# Altium footprint library NXP_60_26022015.PCBLIB: 287 footprints (part 9 of 18)
Each footprint in its own frame and in the unit in brackets; x right, y up, seen from the top. Pads: shape width x height; smd on the part's side, far side on the other; paste and mask are expansions set on the pad; w line width, h text height; cw(c..) or ccw(c..) is an arc to the next point about the centre after c.
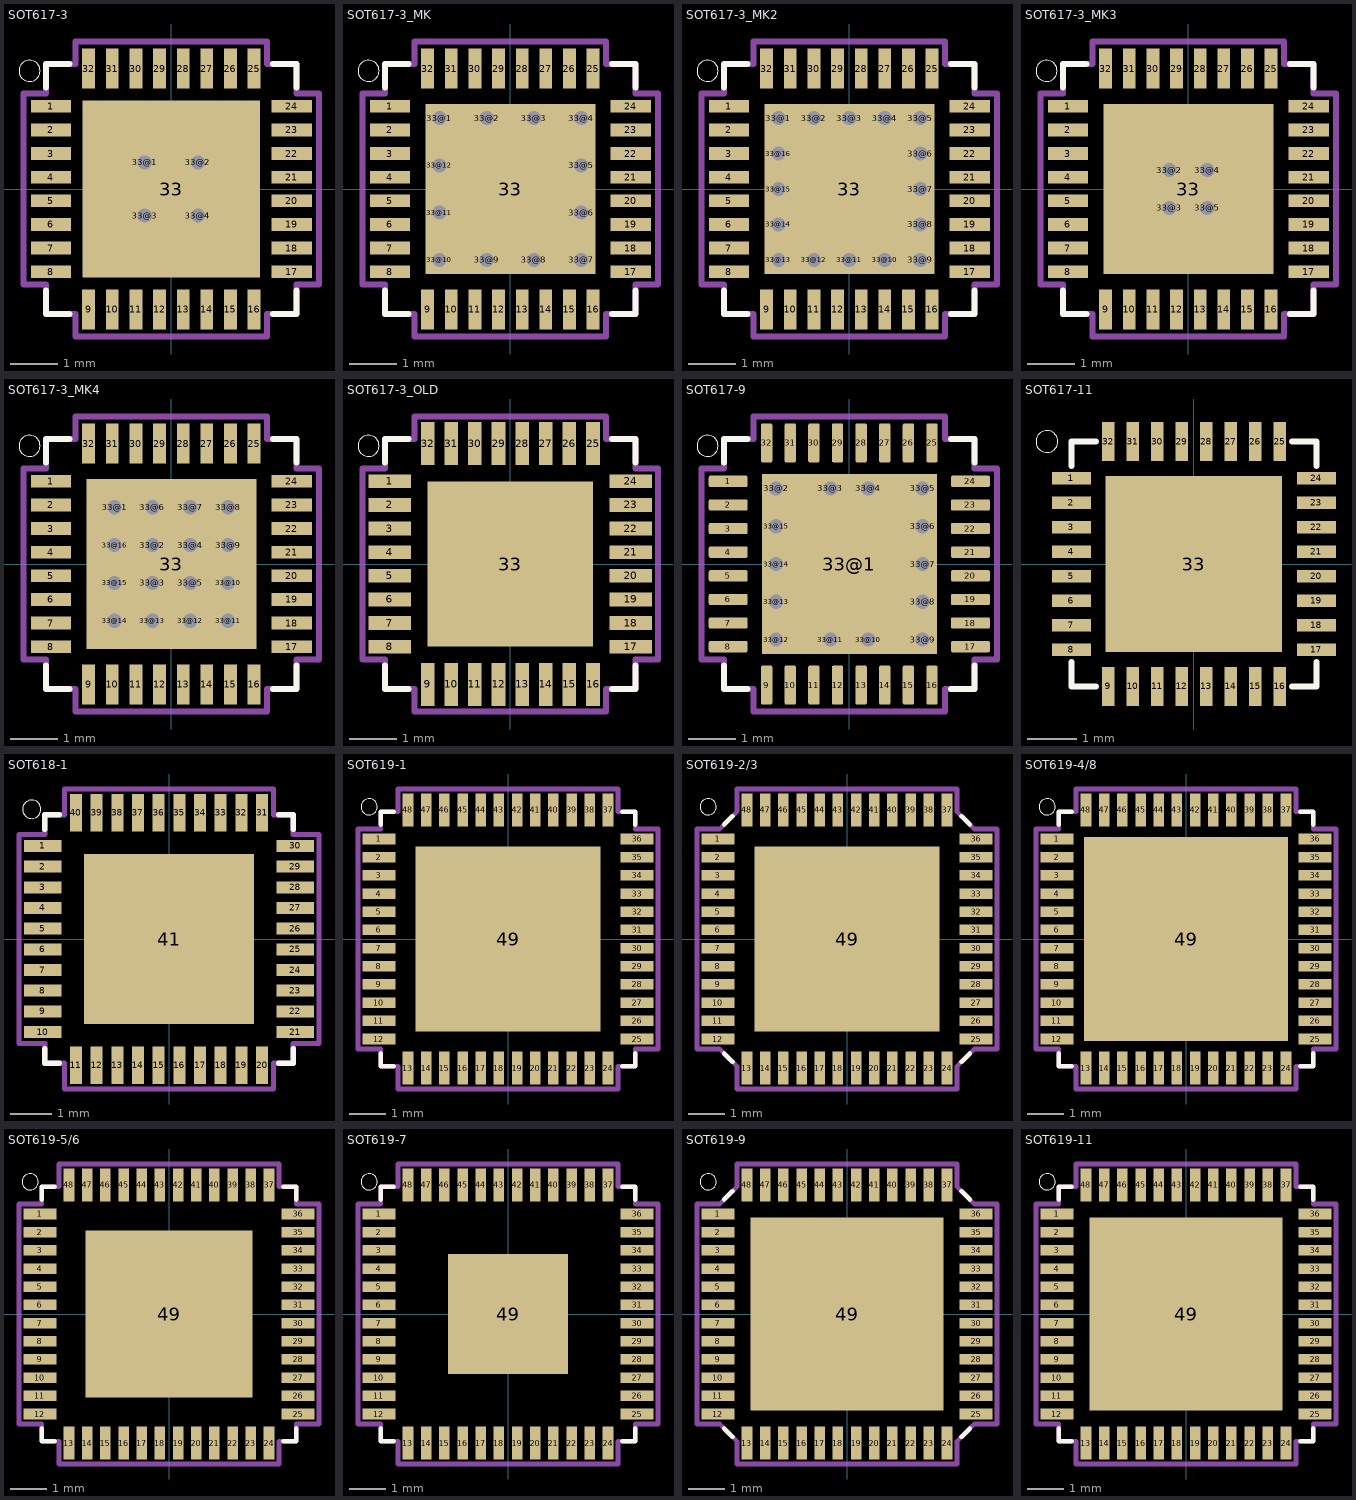
[diagram p8: the footprints below, top view; thin cyan lines are the x and y axes]

## SOT617-3 [mm]
pads (37):
  rect 0.85x0.27 smd: 1(-2.55,1.75) 2(-2.55,1.25) 3(-2.55,0.75) 4(-2.55,0.25) 5(-2.55,-0.25) 6(-2.55,-0.75) 7(-2.55,-1.25) 8(-2.55,-1.75) 17(2.55,-1.75) 18(2.55,-1.25) 19(2.55,-0.75) 20(2.55,-0.25) 21(2.55,0.25) 22(2.55,0.75) 23(2.55,1.25) 24(2.55,1.75)
  rect 0.27x0.85 smd: 9(-1.75,-2.55) 10(-1.25,-2.55) 11(-0.75,-2.55) 12(-0.25,-2.55) 13(0.25,-2.55) 14(0.75,-2.55) 15(1.25,-2.55) 16(1.75,-2.55) 25(1.75,2.55) 26(1.25,2.55) 27(0.75,2.55) 28(0.25,2.55) 29(-0.25,2.55) 30(-0.75,2.55) 31(-1.25,2.55) 32(-1.75,2.55)
  rect 3.75x3.75 smd: 33(0,0)
  round 0.6 hole 0.3: 33@1(-0.563,0.563) 33@2(0.563,0.563) 33@3(-0.563,-0.563) 33@4(0.563,-0.563)
Top Overlay:
  circle w0: c-3,2.5 r0.224
  lines w0.127: -2.65,-2.15 -2.65,-2.65 -2.15,-2.65 ; -2.65,2.15 -2.65,2.65 -2.15,2.65 ; 2.15,-2.65 2.65,-2.65 2.65,-2.15 ; 2.15,2.65 2.65,2.65 2.65,2.15
Top Paste:
  circle w0: c0,0 r0.3
  circle w0: c-1.125,1.125 r0.3
  circle w0: c0,1.125 r0.3
  circle w0: c1.125,1.125 r0.3
  circle w0: c1.125,0 r0.3
  circle w0: c1.125,-1.125 r0.3
  circle w0: c0,-1.125 r0.3
  circle w0: c-1.125,-1.125 r0.3
  circle w0: c-1.125,0 r0.3
Mechanical 16:
  lines w0.127: -3.125,-2.025 -3.125,2.025 -2.65,2.025 -2.65,2.65 -2.025,2.65 -2.025,3.125 2.025,3.125 2.025,2.65 2.65,2.65 2.65,2.025 3.125,2.025 3.125,-2.025 2.65,-2.025 2.65,-2.65 2.025,-2.65 2.025,-3.125 -2.025,-3.125 -2.025,-2.65 -2.65,-2.65 -2.65,-2.025 -3.125,-2.025

## SOT617-3_MK [mm]
pads (45):
  rect 0.85x0.27 smd: 1(-2.55,1.75) 2(-2.55,1.25) 3(-2.55,0.75) 4(-2.55,0.25) 5(-2.55,-0.25) 6(-2.55,-0.75) 7(-2.55,-1.25) 8(-2.55,-1.75) 17(2.55,-1.75) 18(2.55,-1.25) 19(2.55,-0.75) 20(2.55,-0.25) 21(2.55,0.25) 22(2.55,0.75) 23(2.55,1.25) 24(2.55,1.75)
  rect 0.27x0.85 smd: 9(-1.75,-2.55) 10(-1.25,-2.55) 11(-0.75,-2.55) 12(-0.25,-2.55) 13(0.25,-2.55) 14(0.75,-2.55) 15(1.25,-2.55) 16(1.75,-2.55) 25(1.75,2.55) 26(1.25,2.55) 27(0.75,2.55) 28(0.25,2.55) 29(-0.25,2.55) 30(-0.75,2.55) 31(-1.25,2.55) 32(-1.75,2.55)
  rect 3.6x3.6 smd: 33(0,0)
  round 0.6 hole 0.3: 33@1(-1.5,1.5) 33@2(-0.5,1.5) 33@3(0.5,1.5) 33@4(1.5,1.5) 33@5(1.5,0.5) 33@6(1.5,-0.5) 33@7(1.5,-1.5) 33@8(0.5,-1.5) 33@9(-0.5,-1.5) 33@10(-1.5,-1.5) 33@11(-1.5,-0.5) 33@12(-1.5,0.5)
Top Overlay:
  circle w0: c-3,2.5 r0.224
  lines w0.127: -2.65,-2.15 -2.65,-2.65 -2.15,-2.65 ; -2.65,2.15 -2.65,2.65 -2.15,2.65 ; 2.15,-2.65 2.65,-2.65 2.65,-2.15 ; 2.15,2.65 2.65,2.65 2.65,2.15
Top Paste:
  rectangle: -0.25,-0.25 0.25,0.25
  rectangle: -1.05,-0.25 -0.55,0.25
  rectangle: 0.55,-0.25 1.05,0.25
  rectangle: -0.25,0.55 0.25,1.05
  rectangle: -0.25,-1.05 0.25,-0.55
  rectangle: 0.55,0.55 1.05,1.05
  rectangle: -1.05,0.55 -0.55,1.05
  rectangle: -1.05,-1.05 -0.55,-0.55
  rectangle: 0.55,-1.05 1.05,-0.55
Mechanical 16:
  lines w0.127: -3.125,-2.025 -3.125,2.025 -2.65,2.025 -2.65,2.65 -2.025,2.65 -2.025,3.125 2.025,3.125 2.025,2.65 2.65,2.65 2.65,2.025 3.125,2.025 3.125,-2.025 2.65,-2.025 2.65,-2.65 2.025,-2.65 2.025,-3.125 -2.025,-3.125 -2.025,-2.65 -2.65,-2.65 -2.65,-2.025 -3.125,-2.025

## SOT617-3_MK2 [mm]
pads (49):
  rect 0.85x0.27 smd: 1(-2.55,1.75) 2(-2.55,1.25) 3(-2.55,0.75) 4(-2.55,0.25) 5(-2.55,-0.25) 6(-2.55,-0.75) 7(-2.55,-1.25) 8(-2.55,-1.75) 17(2.55,-1.75) 18(2.55,-1.25) 19(2.55,-0.75) 20(2.55,-0.25) 21(2.55,0.25) 22(2.55,0.75) 23(2.55,1.25) 24(2.55,1.75)
  rect 0.27x0.85 smd: 9(-1.75,-2.55) 10(-1.25,-2.55) 11(-0.75,-2.55) 12(-0.25,-2.55) 13(0.25,-2.55) 14(0.75,-2.55) 15(1.25,-2.55) 16(1.75,-2.55) 25(1.75,2.55) 26(1.25,2.55) 27(0.75,2.55) 28(0.25,2.55) 29(-0.25,2.55) 30(-0.75,2.55) 31(-1.25,2.55) 32(-1.75,2.55)
  rect 3.6x3.6 smd: 33(0,0)
  round 0.6 hole 0.3: 33@1(-1.5,1.5) 33@2(-0.75,1.5) 33@3(0,1.5) 33@4(0.75,1.5) 33@5(1.5,1.5) 33@6(1.5,0.75) 33@7(1.5,0) 33@8(1.5,-0.75) 33@9(1.5,-1.5) 33@10(0.75,-1.5) 33@11(0,-1.5) 33@12(-0.75,-1.5) 33@13(-1.5,-1.5) 33@14(-1.5,-0.75) 33@15(-1.5,0) 33@16(-1.5,0.75)
Top Overlay:
  circle w0: c-3,2.5 r0.224
  lines w0.127: -2.65,-2.15 -2.65,-2.65 -2.15,-2.65 ; -2.65,2.15 -2.65,2.65 -2.15,2.65 ; 2.15,-2.65 2.65,-2.65 2.65,-2.15 ; 2.15,2.65 2.65,2.65 2.65,2.15
Top Paste:
  rectangle: -0.25,-0.25 0.25,0.25
  rectangle: -1.05,-0.25 -0.55,0.25
  rectangle: 0.55,-0.25 1.05,0.25
  rectangle: -0.25,0.55 0.25,1.05
  rectangle: -0.25,-1.05 0.25,-0.55
  rectangle: 0.55,0.55 1.05,1.05
  rectangle: -1.05,0.55 -0.55,1.05
  rectangle: -1.05,-1.05 -0.55,-0.55
  rectangle: 0.55,-1.05 1.05,-0.55
Mechanical 16:
  lines w0.127: -3.125,-2.025 -3.125,2.025 -2.65,2.025 -2.65,2.65 -2.025,2.65 -2.025,3.125 2.025,3.125 2.025,2.65 2.65,2.65 2.65,2.025 3.125,2.025 3.125,-2.025 2.65,-2.025 2.65,-2.65 2.025,-2.65 2.025,-3.125 -2.025,-3.125 -2.025,-2.65 -2.65,-2.65 -2.65,-2.025 -3.125,-2.025

## SOT617-3_MK3 [mm]
pads (37):
  rect 0.85x0.27 smd: 1(-2.55,1.75) 2(-2.55,1.25) 3(-2.55,0.75) 4(-2.55,0.25) 5(-2.55,-0.25) 6(-2.55,-0.75) 7(-2.55,-1.25) 8(-2.55,-1.75) 17(2.55,-1.75) 18(2.55,-1.25) 19(2.55,-0.75) 20(2.55,-0.25) 21(2.55,0.25) 22(2.55,0.75) 23(2.55,1.25) 24(2.55,1.75)
  rect 0.27x0.85 smd: 9(-1.75,-2.55) 10(-1.25,-2.55) 11(-0.75,-2.55) 12(-0.25,-2.55) 13(0.25,-2.55) 14(0.75,-2.55) 15(1.25,-2.55) 16(1.75,-2.55) 25(1.75,2.55) 26(1.25,2.55) 27(0.75,2.55) 28(0.25,2.55) 29(-0.25,2.55) 30(-0.75,2.55) 31(-1.25,2.55) 32(-1.75,2.55)
  rect 3.6x3.6 smd: 33(0,0)
  round 0.6 hole 0.3: 33@2(-0.4,0.4) 33@3(-0.4,-0.4) 33@4(0.4,0.4) 33@5(0.4,-0.4)
Top Overlay:
  circle w0: c-3,2.5 r0.224
  lines w0.127: -2.65,-2.15 -2.65,-2.65 -2.15,-2.65 ; -2.65,2.15 -2.65,2.65 -2.15,2.65 ; 2.15,-2.65 2.65,-2.65 2.65,-2.15 ; 2.15,2.65 2.65,2.65 2.65,2.15
Top Paste:
  rectangle: -0.25,-0.25 0.25,0.25
  rectangle: -1.05,-0.25 -0.55,0.25
  rectangle: 0.55,-0.25 1.05,0.25
  rectangle: -0.25,0.55 0.25,1.05
  rectangle: -0.25,-1.05 0.25,-0.55
  rectangle: 0.55,0.55 1.05,1.05
  rectangle: -1.05,0.55 -0.55,1.05
  rectangle: -1.05,-1.05 -0.55,-0.55
  rectangle: 0.55,-1.05 1.05,-0.55
Mechanical 16:
  lines w0.127: -3.125,-2.025 -3.125,2.025 -2.65,2.025 -2.65,2.65 -2.025,2.65 -2.025,3.125 2.025,3.125 2.025,2.65 2.65,2.65 2.65,2.025 3.125,2.025 3.125,-2.025 2.65,-2.025 2.65,-2.65 2.025,-2.65 2.025,-3.125 -2.025,-3.125 -2.025,-2.65 -2.65,-2.65 -2.65,-2.025 -3.125,-2.025

## SOT617-3_MK4 [mm]
pads (49):
  rect 0.85x0.27 smd: 1(-2.55,1.75) 2(-2.55,1.25) 3(-2.55,0.75) 4(-2.55,0.25) 5(-2.55,-0.25) 6(-2.55,-0.75) 7(-2.55,-1.25) 8(-2.55,-1.75) 17(2.55,-1.75) 18(2.55,-1.25) 19(2.55,-0.75) 20(2.55,-0.25) 21(2.55,0.25) 22(2.55,0.75) 23(2.55,1.25) 24(2.55,1.75)
  rect 0.27x0.85 smd: 9(-1.75,-2.55) 10(-1.25,-2.55) 11(-0.75,-2.55) 12(-0.25,-2.55) 13(0.25,-2.55) 14(0.75,-2.55) 15(1.25,-2.55) 16(1.75,-2.55) 25(1.75,2.55) 26(1.25,2.55) 27(0.75,2.55) 28(0.25,2.55) 29(-0.25,2.55) 30(-0.75,2.55) 31(-1.25,2.55) 32(-1.75,2.55)
  rect 3.6x3.6 smd: 33(0,0)
  round 0.6 hole 0.3: 33@1(-1.2,1.2) 33@2(-0.4,0.4) 33@3(-0.4,-0.4) 33@4(0.4,0.4) 33@5(0.4,-0.4) 33@6(-0.4,1.2) 33@7(0.4,1.2) 33@8(1.2,1.2) 33@9(1.2,0.4) 33@10(1.2,-0.4) 33@11(1.2,-1.2) 33@12(0.4,-1.2) 33@13(-0.4,-1.2) 33@14(-1.2,-1.2) 33@15(-1.2,-0.4) 33@16(-1.2,0.4)
Top Overlay:
  circle w0: c-3,2.5 r0.224
  lines w0.127: -2.65,-2.15 -2.65,-2.65 -2.15,-2.65 ; -2.65,2.15 -2.65,2.65 -2.15,2.65 ; 2.15,-2.65 2.65,-2.65 2.65,-2.15 ; 2.15,2.65 2.65,2.65 2.65,2.15
Top Paste:
  rectangle: -0.25,-0.25 0.25,0.25
  rectangle: -1.05,-0.25 -0.55,0.25
  rectangle: 0.55,-0.25 1.05,0.25
  rectangle: -0.25,0.55 0.25,1.05
  rectangle: -0.25,-1.05 0.25,-0.55
  rectangle: 0.55,0.55 1.05,1.05
  rectangle: -1.05,0.55 -0.55,1.05
  rectangle: -1.05,-1.05 -0.55,-0.55
  rectangle: 0.55,-1.05 1.05,-0.55
Mechanical 16:
  lines w0.127: -3.125,-2.025 -3.125,2.025 -2.65,2.025 -2.65,2.65 -2.025,2.65 -2.025,3.125 2.025,3.125 2.025,2.65 2.65,2.65 2.65,2.025 3.125,2.025 3.125,-2.025 2.65,-2.025 2.65,-2.65 2.025,-2.65 2.025,-3.125 -2.025,-3.125 -2.025,-2.65 -2.65,-2.65 -2.65,-2.025 -3.125,-2.025

## SOT617-3_OLD [mm]
pads (33):
  rect 0.9x0.29 smd: 1(-2.55,1.75) 2(-2.55,1.25) 3(-2.55,0.75) 4(-2.55,0.25) 5(-2.55,-0.25) 6(-2.55,-0.75) 7(-2.55,-1.25) 8(-2.55,-1.75) 17(2.55,-1.75) 18(2.55,-1.25) 19(2.55,-0.75) 20(2.55,-0.25) 21(2.55,0.25) 22(2.55,0.75) 23(2.55,1.25) 24(2.55,1.75)
  rect 0.29x0.9 smd: 9(-1.75,-2.55) 10(-1.25,-2.55) 11(-0.75,-2.55) 12(-0.25,-2.55) 13(0.25,-2.55) 14(0.75,-2.55) 15(1.25,-2.55) 16(1.75,-2.55) 25(1.75,2.55) 26(1.25,2.55) 27(0.75,2.55) 28(0.25,2.55) 29(-0.25,2.55) 30(-0.75,2.55) 31(-1.25,2.55) 32(-1.75,2.55)
  rect 3.5x3.5 smd: 33(0,0)
Top Overlay:
  circle w0: c-3,2.5 r0.224
  lines w0.127: -2.65,-2.15 -2.65,-2.65 -2.15,-2.65 ; -2.65,2.15 -2.65,2.65 -2.15,2.65 ; 2.15,-2.65 2.65,-2.65 2.65,-2.15 ; 2.15,2.65 2.65,2.65 2.65,2.15
Top Paste:
  rectangle: -0.25,-0.25 0.25,0.25
  rectangle: -1.05,-0.25 -0.55,0.25
  rectangle: 0.55,-0.25 1.05,0.25
  rectangle: -0.25,0.55 0.25,1.05
  rectangle: -0.25,-1.05 0.25,-0.55
  rectangle: 0.55,0.55 1.05,1.05
  rectangle: -1.05,0.55 -0.55,1.05
  rectangle: -1.05,-1.05 -0.55,-0.55
  rectangle: 0.55,-1.05 1.05,-0.55
Mechanical 16:
  lines w0.127: -3.125,-2.025 -3.125,2.025 -2.65,2.025 -2.65,2.65 -2.025,2.65 -2.025,3.125 2.025,3.125 2.025,2.65 2.65,2.65 2.65,2.025 3.125,2.025 3.125,-2.025 2.65,-2.025 2.65,-2.65 2.025,-2.65 2.025,-3.125 -2.025,-3.125 -2.025,-2.65 -2.65,-2.65 -2.65,-2.025 -3.125,-2.025

## SOT617-9 [mm]
pads (47):
  rrect30% 0.825x0.24 smd: 1(-2.563,1.75) 2(-2.563,1.25) 3(-2.563,0.75) 4(-2.563,0.25) 5(-2.563,-0.25) 6(-2.563,-0.75) 7(-2.563,-1.25) 8(-2.563,-1.75) 17(2.563,-1.75) 18(2.563,-1.25) 19(2.563,-0.75) 20(2.563,-0.25) 21(2.563,0.25) 22(2.563,0.75) 23(2.563,1.25) 24(2.563,1.75)
  rrect30% 0.24x0.825 smd: 9(-1.75,-2.563) 10(-1.25,-2.563) 11(-0.75,-2.563) 12(-0.25,-2.563) 13(0.25,-2.563) 14(0.75,-2.563) 15(1.25,-2.563) 16(1.75,-2.563) 25(1.75,2.563) 26(1.25,2.563) 27(0.75,2.563) 28(0.25,2.563) 29(-0.25,2.563) 30(-0.75,2.563) 31(-1.25,2.563) 32(-1.75,2.563)
  rect 3.7x3.8 smd: 33@1(0,0)
  round 0.6 hole 0.3: 33@2(-1.55,1.6) 33@3(-0.4,1.6) 33@4(0.4,1.6) 33@5(1.55,1.6) 33@6(1.55,0.8) 33@7(1.55,0) 33@8(1.55,-0.8) 33@9(1.55,-1.6) 33@10(0.4,-1.6) 33@11(-0.4,-1.6) 33@12(-1.55,-1.6) 33@13(-1.55,-0.8) 33@14(-1.55,0) 33@15(-1.55,0.8)
Top Overlay:
  circle w0: c-3,2.5 r0.224
  lines w0.127: -2.65,-2.15 -2.65,-2.65 -2.15,-2.65 ; -2.65,2.15 -2.65,2.65 -2.15,2.65 ; 2.15,-2.65 2.65,-2.65 2.65,-2.15 ; 2.15,2.65 2.65,2.65 2.65,2.15
Top Paste:
  rectangle: -1.025,0.25 -0.225,1.05
  rectangle: 0.225,0.25 1.025,1.05
  rectangle: 0.225,-1.05 1.025,-0.25
  rectangle: -1.025,-1.05 -0.225,-0.25
Mechanical 16:
  lines w0.127: -3.125,-2.025 -3.125,2.025 -2.65,2.025 -2.65,2.65 -2.025,2.65 -2.025,3.125 2.025,3.125 2.025,2.65 2.65,2.65 2.65,2.025 3.125,2.025 3.125,-2.025 2.65,-2.025 2.65,-2.65 2.025,-2.65 2.025,-3.125 -2.025,-3.125 -2.025,-2.65 -2.65,-2.65 -2.65,-2.025 -3.125,-2.025

## SOT617-11 [mil]
pads (33):
  rect 31.5x9.84 smd: 1(-98.43,68.9) 2(-98.43,49.21) 3(-98.43,29.53) 4(-98.43,9.84) 5(-98.43,-9.84) 6(-98.43,-29.53) 7(-98.43,-49.21) 8(-98.43,-68.9) 17(98.43,-68.9) 18(98.43,-49.21) 19(98.43,-29.53) 20(98.43,-9.84) 21(98.43,9.84) 22(98.43,29.53) 23(98.43,49.21) 24(98.43,68.9)
  rect 9.84x31.5 smd: 9(-68.9,-98.43) 10(-49.21,-98.43) 11(-29.53,-98.43) 12(-9.84,-98.43) 13(9.84,-98.43) 14(29.53,-98.43) 15(49.21,-98.43) 16(68.9,-98.43) 25(68.9,98.43) 26(49.21,98.43) 27(29.53,98.43) 28(9.84,98.43) 29(-9.84,98.43) 30(-29.53,98.43) 31(-49.21,98.43) 32(-68.9,98.43)
  rect 141.73x141.73 smd: 33(0,0)
Top Overlay:
  circle w0: c-118.11,98.43 r8.8
  lines w5: -98.43,-78.74 -98.43,-98.43 -78.74,-98.43 ; -98.43,78.74 -98.43,98.43 -78.74,98.43 ; 78.74,-98.43 98.43,-98.43 98.43,-78.74 ; 78.74,98.43 98.43,98.43 98.43,78.74
Top Paste:
  rectangle: -17.72,-17.72 17.72,17.72
  rectangle: 27.56,-17.72 62.99,17.72
  rectangle: -17.72,27.56 17.72,62.99
  rectangle: -62.99,27.56 -27.56,62.99
  rectangle: -62.99,-17.72 -27.56,17.72
  rectangle: -62.99,-62.99 -27.56,-27.56
  rectangle: -17.72,-62.99 17.72,-27.56
  rectangle: 27.56,-62.99 62.99,-27.56
  rectangle: 27.56,27.56 62.99,62.99
  rectangle: -13.78,83.66 -5.91,113.19
  rectangle: -33.46,83.66 -25.59,113.19
  rectangle: -53.15,83.66 -45.28,113.19
  rectangle: -72.83,83.66 -64.96,113.19
  rectangle: 5.91,83.66 13.78,113.19
  rectangle: 25.59,83.66 33.46,113.19
  rectangle: 45.28,83.66 53.15,113.19
  rectangle: 64.96,83.66 72.83,113.19
  rectangle: -72.83,-113.19 -64.96,-83.66
  rectangle: -53.15,-113.19 -45.28,-83.66
  rectangle: -33.46,-113.19 -25.59,-83.66
  rectangle: -13.78,-113.19 -5.91,-83.66
  rectangle: 5.91,-113.19 13.78,-83.66
  rectangle: 25.59,-113.19 33.46,-83.66
  rectangle: 45.28,-113.19 53.15,-83.66
  rectangle: 64.96,-113.19 72.83,-83.66
  region: 113.19,5.91 113.19,13.78 83.66,13.78 83.66,5.91
  region: 113.19,25.59 113.19,33.46 83.66,33.46 83.66,25.59
  region: 113.19,45.28 113.19,53.15 83.66,53.15 83.66,45.28
  region: 113.19,64.96 113.19,72.83 83.66,72.83 83.66,64.96
  region: 113.19,-13.78 113.19,-5.91 83.66,-5.91 83.66,-13.78
  region: 113.19,-33.46 113.19,-25.59 83.66,-25.59 83.66,-33.46
  region: 113.19,-53.15 113.19,-45.28 83.66,-45.28 83.66,-53.15
  region: 113.19,-72.83 113.19,-64.96 83.66,-64.96 83.66,-72.83
  region: -83.66,-72.83 -83.66,-64.96 -113.19,-64.96 -113.19,-72.83
  region: -83.66,-53.15 -83.66,-45.28 -113.19,-45.28 -113.19,-53.15
  region: -83.66,-33.46 -83.66,-25.59 -113.19,-25.59 -113.19,-33.46
  region: -83.66,-13.78 -83.66,-5.91 -113.19,-5.91 -113.19,-13.78
  region: -83.66,5.91 -83.66,13.78 -113.19,13.78 -113.19,5.91
  region: -83.66,25.59 -83.66,33.46 -113.19,33.46 -113.19,25.59
  region: -83.66,45.28 -83.66,53.15 -113.19,53.15 -113.19,45.28
  region: -83.66,64.96 -83.66,72.83 -113.19,72.83 -113.19,64.96

## SOT618-1 [mm]
pads (41):
  rect 0.9x0.29 smd: 1(-3.05,2.25) 2(-3.05,1.75) 3(-3.05,1.25) 4(-3.05,0.75) 5(-3.05,0.25) 6(-3.05,-0.25) 7(-3.05,-0.75) 8(-3.05,-1.25) 9(-3.05,-1.75) 10(-3.05,-2.25) 21(3.05,-2.25) 22(3.05,-1.75) 23(3.05,-1.25) 24(3.05,-0.75) 25(3.05,-0.25) 26(3.05,0.25) 27(3.05,0.75) 28(3.05,1.25) 29(3.05,1.75) 30(3.05,2.25)
  rect 0.29x0.9 smd: 11(-2.25,-3.05) 12(-1.75,-3.05) 13(-1.25,-3.05) 14(-0.75,-3.05) 15(-0.25,-3.05) 16(0.25,-3.05) 17(0.75,-3.05) 18(1.25,-3.05) 19(1.75,-3.05) 20(2.25,-3.05) 31(2.25,3.05) 32(1.75,3.05) 33(1.25,3.05) 34(0.75,3.05) 35(0.25,3.05) 36(-0.25,3.05) 37(-0.75,3.05) 38(-1.25,3.05) 39(-1.75,3.05) 40(-2.25,3.05)
  rect 4.1x4.1 smd: 41(0,0)
Top Overlay:
  circle w0: c-3.317,3.135 r0.224
  lines w0.127: -3,-2.65 -3,-3 -2.65,-3 ; -3,2.65 -3,3 -2.65,3 ; 2.65,-3 3,-3 3,-2.65 ; 2.65,3 3,3 3,2.65
Top Paste:
  rectangle: -0.3,-0.3 0.3,0.3
  rectangle: 0.6,-0.3 1.2,0.3
  rectangle: -1.2,-0.3 -0.6,0.3
  rectangle: -1.2,0.6 -0.6,1.2
  rectangle: -0.3,0.6 0.3,1.2
  rectangle: 0.6,0.6 1.2,1.2
  rectangle: -1.2,-1.2 -0.6,-0.6
  rectangle: -0.3,-1.2 0.3,-0.6
  rectangle: 0.6,-1.2 1.2,-0.6
Mechanical 16:
  lines w0.127: -3.625,-2.525 -3.625,2.525 -3,2.525 -3,3 -2.525,3 -2.525,3.625 2.525,3.625 2.525,3 3,3 3,2.525 3.625,2.525 3.625,-2.525 3,-2.525 3,-3 2.525,-3 2.525,-3.625 -2.525,-3.625 -2.525,-3 -3,-3 -3,-2.525 -3.625,-2.525

## SOT619-1 [mm]
pads (49):
  rect 0.9x0.29 smd: 1(-3.55,2.75) 2(-3.55,2.25) 3(-3.55,1.75) 4(-3.55,1.25) 5(-3.55,0.75) 6(-3.55,0.25) 7(-3.55,-0.25) 8(-3.55,-0.75) 9(-3.55,-1.25) 10(-3.55,-1.75) 11(-3.55,-2.25) 12(-3.55,-2.75) 25(3.55,-2.75) 26(3.55,-2.25) 27(3.55,-1.75) 28(3.55,-1.25) 29(3.55,-0.75) 30(3.55,-0.25) 31(3.55,0.25) 32(3.55,0.75) 33(3.55,1.25) 34(3.55,1.75) 35(3.55,2.25) 36(3.55,2.75)
  rect 0.29x0.9 smd: 13(-2.75,-3.55) 14(-2.25,-3.55) 15(-1.75,-3.55) 16(-1.25,-3.55) 17(-0.75,-3.55) 18(-0.25,-3.55) 19(0.25,-3.55) 20(0.75,-3.55) 21(1.25,-3.55) 22(1.75,-3.55) 23(2.25,-3.55) 24(2.75,-3.55) 37(2.75,3.55) 38(2.25,3.55) 39(1.75,3.55) 40(1.25,3.55) 41(0.75,3.55) 42(0.25,3.55) 43(-0.25,3.55) 44(-0.75,3.55) 45(-1.25,3.55) 46(-1.75,3.55) 47(-2.25,3.55) 48(-2.75,3.55)
  rect 5.1x5.1 smd: 49(0,0)
Top Overlay:
  circle w0: c-3.818,3.635 r0.224
  lines w0.127: -3.5,-3.15 -3.5,-3.5 -3.15,-3.5 ; -3.5,3.15 -3.5,3.5 -3.15,3.5 ; 3.15,-3.5 3.5,-3.5 3.5,-3.15 ; 3.15,3.5 3.5,3.5 3.5,3.15
Top Paste:
  rectangle: -0.375,-0.375 0.375,0.375
  rectangle: -1.5,-0.375 -0.75,0.375
  rectangle: -1.5,0.75 -0.75,1.5
  rectangle: -0.375,0.75 0.375,1.5
  rectangle: 0.75,0.75 1.5,1.5
  rectangle: 0.75,-0.375 1.5,0.375
  rectangle: 0.75,-1.5 1.5,-0.75
  rectangle: -0.375,-1.5 0.375,-0.75
  rectangle: -1.5,-1.5 -0.75,-0.75
Mechanical 16:
  lines w0.127: -4.125,-3.025 -4.125,3.025 -3.5,3.025 -3.5,3.5 -3.025,3.5 -3.025,4.125 3.025,4.125 3.025,3.5 3.5,3.5 3.5,3.025 4.125,3.025 4.125,-3.025 3.5,-3.025 3.5,-3.5 3.025,-3.5 3.025,-4.125 -3.025,-4.125 -3.025,-3.5 -3.5,-3.5 -3.5,-3.025 -4.125,-3.025

## SOT619-2/3 [mm]
pads (49):
  rect 0.9x0.29 smd: 1(-3.55,2.75) 2(-3.55,2.25) 3(-3.55,1.75) 4(-3.55,1.25) 5(-3.55,0.75) 6(-3.55,0.25) 7(-3.55,-0.25) 8(-3.55,-0.75) 9(-3.55,-1.25) 10(-3.55,-1.75) 11(-3.55,-2.25) 12(-3.55,-2.75) 25(3.55,-2.75) 26(3.55,-2.25) 27(3.55,-1.75) 28(3.55,-1.25) 29(3.55,-0.75) 30(3.55,-0.25) 31(3.55,0.25) 32(3.55,0.75) 33(3.55,1.25) 34(3.55,1.75) 35(3.55,2.25) 36(3.55,2.75)
  rect 0.29x0.9 smd: 13(-2.75,-3.55) 14(-2.25,-3.55) 15(-1.75,-3.55) 16(-1.25,-3.55) 17(-0.75,-3.55) 18(-0.25,-3.55) 19(0.25,-3.55) 20(0.75,-3.55) 21(1.25,-3.55) 22(1.75,-3.55) 23(2.25,-3.55) 24(2.75,-3.55) 37(2.75,3.55) 38(2.25,3.55) 39(1.75,3.55) 40(1.25,3.55) 41(0.75,3.55) 42(0.25,3.55) 43(-0.25,3.55) 44(-0.75,3.55) 45(-1.25,3.55) 46(-1.75,3.55) 47(-2.25,3.55) 48(-2.75,3.55)
  rect 5.1x5.1 smd: 49(0,0)
Top Overlay:
  circle w0: c-3.818,3.635 r0.224
  lines w0.127: -3.375,-3.15 -3.15,-3.375 ; -3.375,3.15 -3.15,3.375 ; 3.15,-3.375 3.375,-3.15 ; 3.15,3.375 3.375,3.15
Top Paste:
  rectangle: -0.375,-0.375 0.375,0.375
  rectangle: -1.5,-0.375 -0.75,0.375
  rectangle: -1.5,0.75 -0.75,1.5
  rectangle: -0.375,0.75 0.375,1.5
  rectangle: 0.75,0.75 1.5,1.5
  rectangle: 0.75,-0.375 1.5,0.375
  rectangle: 0.75,-1.5 1.5,-0.75
  rectangle: -0.375,-1.5 0.375,-0.75
  rectangle: -1.5,-1.5 -0.75,-0.75
Mechanical 16:
  lines w0.127: -4.125,-3.025 -4.125,3.025 -3.5,3.025 -3.025,3.5 -3.025,4.125 3.025,4.125 3.025,3.5 3.5,3.025 4.125,3.025 4.125,-3.025 3.5,-3.025 3.025,-3.5 3.025,-4.125 -3.025,-4.125 -3.025,-3.5 -3.5,-3.025 -4.125,-3.025

## SOT619-4/8 [mm]
pads (49):
  rect 0.9x0.29 smd: 1(-3.55,2.75) 2(-3.55,2.25) 3(-3.55,1.75) 4(-3.55,1.25) 5(-3.55,0.75) 6(-3.55,0.25) 7(-3.55,-0.25) 8(-3.55,-0.75) 9(-3.55,-1.25) 10(-3.55,-1.75) 11(-3.55,-2.25) 12(-3.55,-2.75) 25(3.55,-2.75) 26(3.55,-2.25) 27(3.55,-1.75) 28(3.55,-1.25) 29(3.55,-0.75) 30(3.55,-0.25) 31(3.55,0.25) 32(3.55,0.75) 33(3.55,1.25) 34(3.55,1.75) 35(3.55,2.25) 36(3.55,2.75)
  rect 0.29x0.9 smd: 13(-2.75,-3.55) 14(-2.25,-3.55) 15(-1.75,-3.55) 16(-1.25,-3.55) 17(-0.75,-3.55) 18(-0.25,-3.55) 19(0.25,-3.55) 20(0.75,-3.55) 21(1.25,-3.55) 22(1.75,-3.55) 23(2.25,-3.55) 24(2.75,-3.55) 37(2.75,3.55) 38(2.25,3.55) 39(1.75,3.55) 40(1.25,3.55) 41(0.75,3.55) 42(0.25,3.55) 43(-0.25,3.55) 44(-0.75,3.55) 45(-1.25,3.55) 46(-1.75,3.55) 47(-2.25,3.55) 48(-2.75,3.55)
  rect 5.6x5.6 smd: 49(0,0)
Top Overlay:
  circle w0: c-3.818,3.635 r0.224
  lines w0.127: -3.5,-3.15 -3.5,-3.5 -3.15,-3.5 ; -3.5,3.15 -3.5,3.5 -3.15,3.5 ; 3.15,-3.5 3.5,-3.5 3.5,-3.15 ; 3.15,3.5 3.5,3.5 3.5,3.15
Top Paste:
  rectangle: -0.375,-0.375 0.375,0.375
  rectangle: -1.5,-0.375 -0.75,0.375
  rectangle: -1.5,0.75 -0.75,1.5
  rectangle: -0.375,0.75 0.375,1.5
  rectangle: 0.75,0.75 1.5,1.5
  rectangle: 0.75,-0.375 1.5,0.375
  rectangle: 0.75,-1.5 1.5,-0.75
  rectangle: -0.375,-1.5 0.375,-0.75
  rectangle: -1.5,-1.5 -0.75,-0.75
Mechanical 16:
  lines w0.127: -4.125,-3.025 -4.125,3.025 -3.5,3.025 -3.5,3.5 -3.025,3.5 -3.025,4.125 3.025,4.125 3.025,3.5 3.5,3.5 3.5,3.025 4.125,3.025 4.125,-3.025 3.5,-3.025 3.5,-3.5 3.025,-3.5 3.025,-4.125 -3.025,-4.125 -3.025,-3.5 -3.5,-3.5 -3.5,-3.025 -4.125,-3.025

## SOT619-5/6 [mm]
pads (49):
  rect 0.9x0.29 smd: 1(-3.55,2.75) 2(-3.55,2.25) 3(-3.55,1.75) 4(-3.55,1.25) 5(-3.55,0.75) 6(-3.55,0.25) 7(-3.55,-0.25) 8(-3.55,-0.75) 9(-3.55,-1.25) 10(-3.55,-1.75) 11(-3.55,-2.25) 12(-3.55,-2.75) 25(3.55,-2.75) 26(3.55,-2.25) 27(3.55,-1.75) 28(3.55,-1.25) 29(3.55,-0.75) 30(3.55,-0.25) 31(3.55,0.25) 32(3.55,0.75) 33(3.55,1.25) 34(3.55,1.75) 35(3.55,2.25) 36(3.55,2.75)
  rect 0.29x0.9 smd: 13(-2.75,-3.55) 14(-2.25,-3.55) 15(-1.75,-3.55) 16(-1.25,-3.55) 17(-0.75,-3.55) 18(-0.25,-3.55) 19(0.25,-3.55) 20(0.75,-3.55) 21(1.25,-3.55) 22(1.75,-3.55) 23(2.25,-3.55) 24(2.75,-3.55) 37(2.75,3.55) 38(2.25,3.55) 39(1.75,3.55) 40(1.25,3.55) 41(0.75,3.55) 42(0.25,3.55) 43(-0.25,3.55) 44(-0.75,3.55) 45(-1.25,3.55) 46(-1.75,3.55) 47(-2.25,3.55) 48(-2.75,3.55)
  rect 4.6x4.6 smd: 49(0,0)
Top Overlay:
  circle w0: c-3.818,3.635 r0.224
  lines w0.127: -3.5,-3.15 -3.5,-3.5 -3.15,-3.5 ; -3.5,3.15 -3.5,3.5 -3.15,3.5 ; 3.15,-3.5 3.5,-3.5 3.5,-3.15 ; 3.15,3.5 3.5,3.5 3.5,3.15
Top Paste:
  rectangle: -0.375,-0.375 0.375,0.375
  rectangle: -1.5,-0.375 -0.75,0.375
  rectangle: -1.5,0.75 -0.75,1.5
  rectangle: -0.375,0.75 0.375,1.5
  rectangle: 0.75,0.75 1.5,1.5
  rectangle: 0.75,-0.375 1.5,0.375
  rectangle: 0.75,-1.5 1.5,-0.75
  rectangle: -0.375,-1.5 0.375,-0.75
  rectangle: -1.5,-1.5 -0.75,-0.75
Mechanical 16:
  lines w0.127: -4.125,-3.025 -4.125,3.025 -3.5,3.025 -3.5,3.5 -3.025,3.5 -3.025,4.125 3.025,4.125 3.025,3.5 3.5,3.5 3.5,3.025 4.125,3.025 4.125,-3.025 3.5,-3.025 3.5,-3.5 3.025,-3.5 3.025,-4.125 -3.025,-4.125 -3.025,-3.5 -3.5,-3.5 -3.5,-3.025 -4.125,-3.025

## SOT619-7 [mm]
pads (49):
  rect 0.9x0.29 smd: 1(-3.55,2.75) 2(-3.55,2.25) 3(-3.55,1.75) 4(-3.55,1.25) 5(-3.55,0.75) 6(-3.55,0.25) 7(-3.55,-0.25) 8(-3.55,-0.75) 9(-3.55,-1.25) 10(-3.55,-1.75) 11(-3.55,-2.25) 12(-3.55,-2.75) 25(3.55,-2.75) 26(3.55,-2.25) 27(3.55,-1.75) 28(3.55,-1.25) 29(3.55,-0.75) 30(3.55,-0.25) 31(3.55,0.25) 32(3.55,0.75) 33(3.55,1.25) 34(3.55,1.75) 35(3.55,2.25) 36(3.55,2.75)
  rect 0.29x0.9 smd: 13(-2.75,-3.55) 14(-2.25,-3.55) 15(-1.75,-3.55) 16(-1.25,-3.55) 17(-0.75,-3.55) 18(-0.25,-3.55) 19(0.25,-3.55) 20(0.75,-3.55) 21(1.25,-3.55) 22(1.75,-3.55) 23(2.25,-3.55) 24(2.75,-3.55) 37(2.75,3.55) 38(2.25,3.55) 39(1.75,3.55) 40(1.25,3.55) 41(0.75,3.55) 42(0.25,3.55) 43(-0.25,3.55) 44(-0.75,3.55) 45(-1.25,3.55) 46(-1.75,3.55) 47(-2.25,3.55) 48(-2.75,3.55)
  rect 3.3x3.3 smd: 49(0,0)
Top Overlay:
  circle w0: c-3.818,3.635 r0.224
  lines w0.127: -3.5,-3.15 -3.5,-3.5 -3.15,-3.5 ; -3.5,3.15 -3.5,3.5 -3.15,3.5 ; 3.15,-3.5 3.5,-3.5 3.5,-3.15 ; 3.15,3.5 3.5,3.5 3.5,3.15
Top Paste:
  rectangle: -1,-1 -0.25,-0.25
  rectangle: -1,0.25 -0.25,1
  rectangle: 0.25,0.25 1,1
  rectangle: 0.25,-1 1,-0.25
Mechanical 16:
  lines w0.127: -4.125,-3.025 -4.125,3.025 -3.5,3.025 -3.5,3.5 -3.025,3.5 -3.025,4.125 3.025,4.125 3.025,3.5 3.5,3.5 3.5,3.025 4.125,3.025 4.125,-3.025 3.5,-3.025 3.5,-3.5 3.025,-3.5 3.025,-4.125 -3.025,-4.125 -3.025,-3.5 -3.5,-3.5 -3.5,-3.025 -4.125,-3.025

## SOT619-9 [mm]
pads (49):
  rect 0.9x0.29 smd: 1(-3.55,2.75) 2(-3.55,2.25) 3(-3.55,1.75) 4(-3.55,1.25) 5(-3.55,0.75) 6(-3.55,0.25) 7(-3.55,-0.25) 8(-3.55,-0.75) 9(-3.55,-1.25) 10(-3.55,-1.75) 11(-3.55,-2.25) 12(-3.55,-2.75) 25(3.55,-2.75) 26(3.55,-2.25) 27(3.55,-1.75) 28(3.55,-1.25) 29(3.55,-0.75) 30(3.55,-0.25) 31(3.55,0.25) 32(3.55,0.75) 33(3.55,1.25) 34(3.55,1.75) 35(3.55,2.25) 36(3.55,2.75)
  rect 0.29x0.9 smd: 13(-2.75,-3.55) 14(-2.25,-3.55) 15(-1.75,-3.55) 16(-1.25,-3.55) 17(-0.75,-3.55) 18(-0.25,-3.55) 19(0.25,-3.55) 20(0.75,-3.55) 21(1.25,-3.55) 22(1.75,-3.55) 23(2.25,-3.55) 24(2.75,-3.55) 37(2.75,3.55) 38(2.25,3.55) 39(1.75,3.55) 40(1.25,3.55) 41(0.75,3.55) 42(0.25,3.55) 43(-0.25,3.55) 44(-0.75,3.55) 45(-1.25,3.55) 46(-1.75,3.55) 47(-2.25,3.55) 48(-2.75,3.55)
  rect 5.3x5.3 smd: 49(0,0)
Top Overlay:
  circle w0: c-3.818,3.635 r0.224
  lines w0.127: -3.375,-3.15 -3.15,-3.375 ; -3.375,3.15 -3.15,3.375 ; 3.15,-3.375 3.375,-3.15 ; 3.15,3.375 3.375,3.15
Top Paste:
  rectangle: -0.375,-0.375 0.375,0.375
  rectangle: -1.5,-0.375 -0.75,0.375
  rectangle: -1.5,0.75 -0.75,1.5
  rectangle: -0.375,0.75 0.375,1.5
  rectangle: 0.75,0.75 1.5,1.5
  rectangle: 0.75,-0.375 1.5,0.375
  rectangle: 0.75,-1.5 1.5,-0.75
  rectangle: -0.375,-1.5 0.375,-0.75
  rectangle: -1.5,-1.5 -0.75,-0.75
Mechanical 16:
  lines w0.127: -4.125,-3.025 -4.125,3.025 -3.5,3.025 -3.025,3.5 -3.025,4.125 3.025,4.125 3.025,3.5 3.5,3.025 4.125,3.025 4.125,-3.025 3.5,-3.025 3.025,-3.5 3.025,-4.125 -3.025,-4.125 -3.025,-3.5 -3.5,-3.025 -4.125,-3.025

## SOT619-11 [mm]
pads (49):
  rect 0.9x0.29 smd: 1(-3.55,2.75) 2(-3.55,2.25) 3(-3.55,1.75) 4(-3.55,1.25) 5(-3.55,0.75) 6(-3.55,0.25) 7(-3.55,-0.25) 8(-3.55,-0.75) 9(-3.55,-1.25) 10(-3.55,-1.75) 11(-3.55,-2.25) 12(-3.55,-2.75) 25(3.55,-2.75) 26(3.55,-2.25) 27(3.55,-1.75) 28(3.55,-1.25) 29(3.55,-0.75) 30(3.55,-0.25) 31(3.55,0.25) 32(3.55,0.75) 33(3.55,1.25) 34(3.55,1.75) 35(3.55,2.25) 36(3.55,2.75)
  rect 0.29x0.9 smd: 13(-2.75,-3.55) 14(-2.25,-3.55) 15(-1.75,-3.55) 16(-1.25,-3.55) 17(-0.75,-3.55) 18(-0.25,-3.55) 19(0.25,-3.55) 20(0.75,-3.55) 21(1.25,-3.55) 22(1.75,-3.55) 23(2.25,-3.55) 24(2.75,-3.55) 37(2.75,3.55) 38(2.25,3.55) 39(1.75,3.55) 40(1.25,3.55) 41(0.75,3.55) 42(0.25,3.55) 43(-0.25,3.55) 44(-0.75,3.55) 45(-1.25,3.55) 46(-1.75,3.55) 47(-2.25,3.55) 48(-2.75,3.55)
  rect 5.3x5.3 smd: 49(0,0)
Top Overlay:
  circle w0: c-3.818,3.635 r0.224
  lines w0.127: -3.5,-3.15 -3.5,-3.5 -3.15,-3.5 ; -3.5,3.15 -3.5,3.5 -3.15,3.5 ; 3.15,-3.5 3.5,-3.5 3.5,-3.15 ; 3.15,3.5 3.5,3.5 3.5,3.15
Top Paste:
  rectangle: -0.375,-0.375 0.375,0.375
  rectangle: -1.5,-0.375 -0.75,0.375
  rectangle: -1.5,0.75 -0.75,1.5
  rectangle: -0.375,0.75 0.375,1.5
  rectangle: 0.75,0.75 1.5,1.5
  rectangle: 0.75,-0.375 1.5,0.375
  rectangle: 0.75,-1.5 1.5,-0.75
  rectangle: -0.375,-1.5 0.375,-0.75
  rectangle: -1.5,-1.5 -0.75,-0.75
Mechanical 16:
  lines w0.127: -4.125,-3.025 -4.125,3.025 -3.5,3.025 -3.5,3.5 -3.025,3.5 -3.025,4.125 3.025,4.125 3.025,3.5 3.5,3.5 3.5,3.025 4.125,3.025 4.125,-3.025 3.5,-3.025 3.5,-3.5 3.025,-3.5 3.025,-4.125 -3.025,-4.125 -3.025,-3.5 -3.5,-3.5 -3.5,-3.025 -4.125,-3.025